# Altium footprint library pUFM_Digital_Interface_R0.1-PCB.PcbLib: 49 footprints (part 3 of 4)
Each footprint in its own frame and in the unit in brackets; x right, y up, seen from the top. Pads: shape width x height; smd on the part's side, far side on the other; paste and mask are expansions set on the pad; w line width, h text height; cw(c..) or ccw(c..) is an arc to the next point about the centre after c.
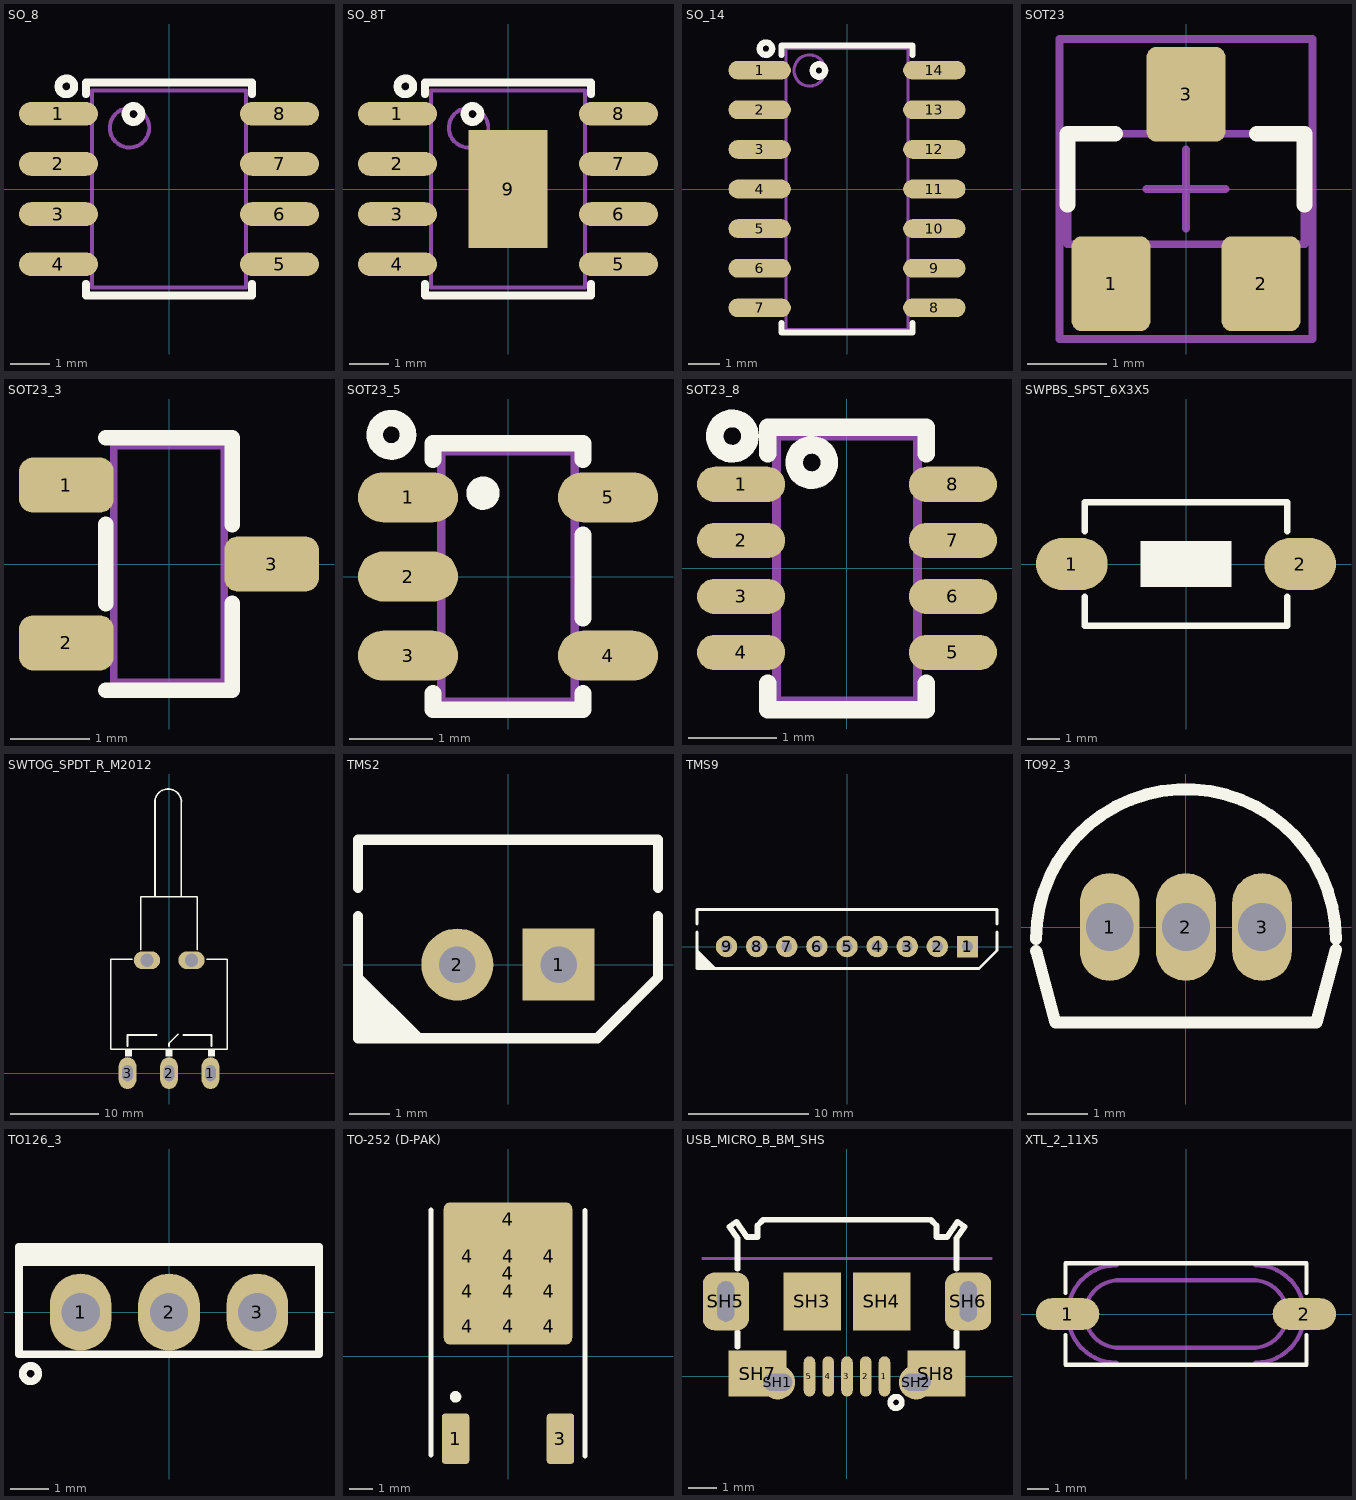
[diagram p2: the footprints below, top view; thin cyan lines are the x and y axes]

## SO_8 [mm] "SOP-8, 5x3.9mm body 1.27mm pitch, SOT96-1, M08A, S8, SOIC8, VO8, MS-012AA(JEDEC), R-8, 8S2, VOG8"
height 1.8
pads (8):
  oval 2x0.6 smd: 1(-2.8,1.905) 2(-2.8,0.635) 3(-2.8,-0.635) 4(-2.8,-1.905) 5(2.8,-1.905) 6(2.8,-0.635) 7(2.8,0.635) 8(2.8,1.905)
Top Overlay:
  circle w0.2: c-2.6,2.6 r0.2
  circle w0.2: c-0.9,1.9 r0.2
  lines w0.2: -2.1,-2.4 -2.1,-2.7 2.1,-2.7 2.1,-2.4 ; -2.1,2.4 -2.1,2.7 2.1,2.7 2.1,2.4
Mechanical 13:
  circle w0.1: c-1,1.55 r0.5
  lines w0.1: -1.95,-2.5 1.95,-2.5 1.95,2.5 -1.95,2.5 -1.95,-2.5
3D body "User Library-so8-3.step": height 1.7, standoff 0, extent -3,-2.45 3,2.45

## SO_8T [mm] "SOP-8, 5x3.9mm body 1.27mm pitch, DDA, SO PowerPAD"
height 1.8
pads (9):
  oval 2x0.6 smd: 1(-2.8,1.905) 2(-2.8,0.635) 3(-2.8,-0.635) 4(-2.8,-1.905) 5(2.8,-1.905) 6(2.8,-0.635) 7(2.8,0.635) 8(2.8,1.905)
  rect 2x3 smd paste-3 mask+0.1: 9(0,0)
Top Overlay:
  circle w0.2: c-2.6,2.6 r0.2
  circle w0.2: c-0.9,1.9 r0.2
  lines w0.2: -2.1,-2.4 -2.1,-2.7 2.1,-2.7 2.1,-2.4 ; -2.1,2.4 -2.1,2.7 2.1,2.7 2.1,2.4
Top Paste:
  rectangle: -0.8,0.2 0.8,1.3
  rectangle: -0.8,-1.3 0.8,-0.2
Mechanical 13:
  circle w0.1: c-1,1.55 r0.5
  lines w0.1: -1.95,-2.5 1.95,-2.5 1.95,2.5 -1.95,2.5 -1.95,-2.5
3D body "User Library-so8-3.step": height 1.7, standoff 0, extent -3,-2.45 3,2.45

## SO_14 [mm] "SOP, SOIC, 3.9mm width, 1.27mm pitch,"
height 6.5
pads (14):
  oval 2x0.6 smd: 1(-2.8,3.81) 2(-2.8,2.54) 3(-2.8,1.27) 4(-2.8,0) 5(-2.8,-1.27) 6(-2.8,-2.54) 7(-2.8,-3.81) 8(2.8,-3.81) 9(2.8,-2.54) 10(2.8,-1.27) 11(2.8,0) 12(2.8,1.27) 13(2.8,2.54) 14(2.8,3.81)
Top Overlay:
  circle w0.2: c-0.9,3.8 r0.2
  circle w0.2: c-2.6,4.5 r0.2
  lines w0.2: -2.1,-4.3 -2.1,-4.6 2.1,-4.6 2.1,-4.3 ; -2.1,4.3 -2.1,4.6 2.1,4.6 2.1,4.3
Mechanical 13:
  circle w0.1: c-1.2,3.8 r0.5
  lines w0.1: -1.95,-4.5 -1.95,4.5 1.95,4.5 1.95,-4.5 -1.95,-4.5
3D body "User Library-SOIC14_JEDEC_MS-012AB.step": height 1.75, standoff -0.01, extent -3.1,-4.375 3.1,4.375

## SOT23 [mm] "SOT23, 3-Leads, Body 2.9x1.3mm, Pitch 0.95mm, Lead Span 2.3mm - Reverse Pinning, IPC High Density"
height 1.1
pads (3):
  rrect25% 1x1.2 smd paste-1.2: 1(-0.95,-1.2) 2(0.95,-1.2) 3(0,1.2)
Top Overlay:
  lines w0.2: -1.5,-0.2 -1.5,0.7 -0.9,0.7 ; 0.9,0.7 1.5,0.7 1.5,-0.2
Top Paste:
  region: -0.55,1.7 -0.55,0.8 -0.55,0.77 -0.527,0.715 -0.485,0.673 -0.43,0.65 -0.4,0.65 0.4,0.65 0.43,0.65 0.485,0.673 0.527,0.715 0.55,0.77 0.55,0.8 0.55,1.7 0.55,1.73 0.527,1.785 0.485,1.827 0.43,1.85 0.4,1.85 -0.4,1.85 -0.43,1.85 -0.485,1.827 -0.527,1.785 -0.55,1.73
  region: 1.5,-1.7 1.5,-0.8 1.5,-0.77 1.477,-0.715 1.435,-0.673 1.38,-0.65 1.35,-0.65 0.55,-0.65 0.52,-0.65 0.465,-0.673 0.423,-0.715 0.4,-0.77 0.4,-0.8 0.4,-1.7 0.4,-1.73 0.423,-1.785 0.465,-1.827 0.52,-1.85 0.55,-1.85 1.35,-1.85 1.38,-1.85 1.435,-1.827 1.477,-1.785 1.5,-1.73
  region: -0.4,-1.7 -0.4,-0.8 -0.4,-0.77 -0.423,-0.715 -0.465,-0.673 -0.52,-0.65 -0.55,-0.65 -1.35,-0.65 -1.38,-0.65 -1.435,-0.673 -1.477,-0.715 -1.5,-0.77 -1.5,-0.8 -1.5,-1.7 -1.5,-1.73 -1.477,-1.785 -1.435,-1.827 -1.38,-1.85 -1.35,-1.85 -0.55,-1.85 -0.52,-1.85 -0.465,-1.827 -0.423,-1.785 -0.4,-1.73
Mechanical 11:
  lines w0.1: -1.176,-0.7 -1.176,-1.25 -0.73,-1.25 -0.73,-0.7 ; -0.5,0 0.5,0 ; -0.223,0.7 -0.223,1.226 0.223,1.226 0.223,0.7 ; 0,-0.5 0,0.5 ; 0.73,-0.7 0.73,-1.25 1.176,-1.25 1.176,-0.7 ; -1.5,-0.7 -1.5,0.7 1.5,0.7 1.5,-0.7 -1.5,-0.7
Mechanical 15:
  lines w0.1: -0.5,0 0.5,0 ; 0,-0.5 0,0.5 ; -1.6,-1.9 -1.6,1.9 1.6,1.9 1.6,-1.9 -1.6,-1.9
3D body "SOT23.stp": height 1.05, standoff 0.03, extent -1.46,-1.25 1.46,1.226
3D body: height 0.04, standoff 0, extent -0.5,0.6 0.5,1.8
3D body: height 0.04, standoff 0, extent 0.45,-1.8 1.45,-0.6
3D body: height 0.04, standoff 0, extent -1.45,-1.8 -0.45,-0.6

## SOT23_3 [mm] "SOT-23, Micro3, MO-178, TO-236AB, MO-193C, SuperSOT3, SC-59, 1.5x3mm, Pitch 1.9mm"
height 2
pads (3):
  rrect50% 1.2x0.7 smd paste-0.05 mask+0.1: 1(-1.3,1) 2(-1.3,-1) 3(1.3,0)
Top Overlay:
  lines w0.2: -0.8,-1.6 0.8,-1.6 0.8,-0.5 ; -0.8,-0.5 -0.8,0.5 ; -0.8,1.6 0.8,1.6 0.8,0.5
Mechanical 13:
  lines w0.1: -0.7,-1.5 -0.7,1.5 0.7,1.5 0.7,-1.5 -0.7,-1.5
3D body "User Library-SOT23-2.STEP": height 1.08, standoff 0, extent -1.32,-1.5 1.32,1.5

## SOT23_5 [mm] "SOT-23-5, SOT25, SOT-25, DBV(R-PDSO-G5), SOT753, TSOT23-5, SC-74A, SOT23-5, S5-T (LINEAR), MO-178AA, MO-193AB(JEDEC), MF05A (NS), TSOP-5(ON), UJ-5 (AD), 1.5x3mm, Pitch 0.65mm"
height 7.62
pads (5):
  oval 1.2x0.6 smd paste-0.05: 1(-1.2,0.95) 2(-1.2,0) 3(-1.2,-0.95) 4(1.2,-0.95) 5(1.2,0.95)
Top Overlay:
  circle w0.2: c-0.3,1 r0.1
  circle w0.2: c-1.4,1.7 r0.2
  lines w0.2: -0.9,-1.4 -0.9,-1.6 0.9,-1.6 0.9,-1.4 ; -0.9,1.4 -0.9,1.6 0.9,1.6 0.9,1.4 ; 0.9,-0.5 0.9,0.5
Mechanical 13:
  lines w0.1: -0.8,-1.5 -0.8,1.5 0.8,1.5 0.8,-1.5 -0.8,-1.5
3D body "CircuitWorks-SOT-23-5.step": height 1.15, standoff 0.05, extent -1.25,-1.5 1.25,1.5

## SOT23_8 [mm] "SOT23, 8-Leads, DCN, DDF, 1.5x3mm, Pitch 0.65mm"
height 1.5
pads (8):
  oval 1x0.4 smd paste-0.05 mask+0.075: 1(-1.2,0.953) 2(-1.2,0.318) 3(-1.2,-0.318) 4(-1.2,-0.953) 5(1.2,-0.953) 6(1.2,-0.318) 7(1.2,0.318) 8(1.2,0.953)
Top Overlay:
  circle w0.2: c-1.3,1.5 r0.2
  circle w0.2: c-0.4,1.2 r0.2
  lines w0.2: -0.9,-1.3 -0.9,-1.6 0.9,-1.6 0.9,-1.3 ; -0.9,1.3 -0.9,1.6 0.9,1.6 0.9,1.3
Mechanical 13:
  lines w0.1: -0.8,-1.5 0.8,-1.5 0.8,1.5 -0.8,1.5 -0.8,-1.5
3D body "User Library-TSOT-23-8.STEP": height 1, standoff 0, extent -1.4,-1.45 1.4,1.45

## SWPBS_SPST_6X3X5 [mm] "SWITCH, PUSHBUTTON, SMD, SPST, 6X3.5mm, SKQMBBE010, 50000 Cycles, 1.57N Force"
height 5
pads (2):
  oval 2.2x1.6 smd mask+0.1: 1(-3.5,0) 2(3.5,0)
Top Overlay:
  region: 1.4,0.7 -1.4,0.7 -1.4,-0.7 1.4,-0.7
  lines w0.2: -3.1,-1 -3.1,-1.9 3.1,-1.9 3.1,-1 ; -3.1,1 -3.1,1.9 3.1,1.9 3.1,1
3D body "43685.stp": height 5, standoff 0, extent -3.649,-1.75 3.65,1.75

## SWTOG_SPDT_R_M2012 [mm] "Switch Toggle, SPDT, THD, RightAngLe, NKK M2012SA2W30, MTS-102-C3"
height 6.5
pads (5):
  oval 2x3.6 hole 1.2 slot 1.8 at 90 deg: 1(4.7,0) 2(0,0) 3(-4.7,0)
  oval 3x2 hole 1.5: ""(-2.5,12.8) ""(2.549,12.8)
Top Overlay:
  rectangle: -0.4,1.9 0.4,2.7
  rectangle: -5,1.9 -4.2,2.7
  rectangle: 4.4,1.9 5.2,2.7
  lines w0.2: -4.699,3.064 -4.699,4.334 -1.397,4.334 ; -4.2,12.9 -6.6,12.9 -6.6,2.7 6.6,2.7 6.6,12.9 4.3,12.9 ; -3.2,13.995 -3.2,20 3.2,20 3.2,14 ; -1.6,20 -1.6,30.9 cw(c-0.1,30.7) 1.408,30.831 ; 0,3.038 0,3.394 1.016,4.41 ; 1.4,20.1 1.4,30.83 ; 1.651,4.334 4.826,4.334 4.826,3.038
3D body "SW3dPS-Switch toggle NKK M2012SA2W30.STEP": height 8.06, standoff -4.18, extent -6.502,-0.575 6.502,32.234

## TMS2 [mm] "Header 2.5mm SPOX,WTB,vert, shrouded, 2w"
height 5.9
pads (2):
  rect 1.778x1.778 hole 0.9: 1(1.25,0)
  round 1.778 hole 0.9: 2(-1.25,0)
Top Overlay:
  region: -3.7,-0.32 -3.7,-1.82 -2.2,-1.82
  lines w0.254: -3.7,-0.32 -2.2,-1.82 ; -3.7,1.19 -3.7,-1.82 2.2,-1.82 3.7,-0.32 3.7,1.19 ; -3.7,1.89 -3.7,3.08 3.7,3.08 3.7,1.89
3D body "Header Pad1.stp": height 0.04, standoff 0, extent 0.35,-0.9 2.15,0.9
3D body "Header Pad1.stp": height 0.04, standoff 0, extent 0.35,-0.9 2.15,0.9
3D body "Header Pad.stp": height 0.04, standoff 0, extent -2.15,-0.9 -0.35,0.9
3D body "Header Pad.stp": height 0.04, standoff 0, extent -2.15,-0.9 -0.35,0.9
3D body "TMS2-ST.stp": height 5.9, standoff -3.5, extent -3.7,-1.825 3.7,3.075

## TMS9 [mil] "Header 2.5mm SPOX,WTB,vert, shrouded, 9w"
height 232.28
pads (9):
  rect 70x70 hole 35.43: 1(393.72,0)
  round 70 hole 35.43: 2(295.3,0) 3(196.87,0) 4(98.44,0) 5(0.01,0) 6(-98.43,0) 7(-196.86,0) 8(-295.29,0) 9(-393.72,0)
Top Overlay:
  region: -490.18,-12.6 -490.18,-71.66 -431.13,-71.66
  lines w10: -490.18,-12.6 -431.13,-71.66 ; -490.18,46.84 -490.18,-71.66 431.12,-71.65 490.18,-12.59 490.18,46.85 ; -490.18,74.4 -490.18,121.25 490.18,121.26 490.18,74.41
3D body "TMS9-ST.stp": height 232.28, standoff -137.8, extent -490.15,-71.65 490.16,121.26
3D body "Header Pad.stp": height 1.38, standoff 0, extent -429.16,-35.44 -358.29,35.43
3D body "Header Pad.stp": height 1.38, standoff 0, extent -429.15,-35.44 -358.28,35.43
3D body "Header Pad.stp": height 1.38, standoff 0, extent -330.71,-35.44 -259.85,35.43
3D body "Header Pad.stp": height 1.38, standoff 0, extent -330.73,-35.44 -259.86,35.43
3D body "Header Pad.stp": height 1.38, standoff 0, extent -35.43,-35.44 35.44,35.43
3D body "Header Pad.stp": height 1.38, standoff 0, extent -35.42,-35.44 35.45,35.43
3D body "Header Pad.stp": height 1.38, standoff 0, extent 63.01,-35.44 133.88,35.43
3D body "Header Pad.stp": height 1.38, standoff 0, extent 63,-35.44 133.87,35.43
3D body "Header Pad.stp": height 1.38, standoff 0, extent 161.43,-35.43 232.3,35.43
3D body "Header Pad.stp": height 1.38, standoff 0, extent 161.45,-35.43 232.31,35.44
3D body "Header Pad1.stp": height 1.38, standoff 0, extent 358.29,-35.43 429.16,35.44
3D body "Header Pad1.stp": height 1.38, standoff 0, extent 358.28,-35.44 429.15,35.43
3D body "Header Pad.stp": height 1.38, standoff 0, extent 259.87,-35.43 330.74,35.44
3D body "Header Pad.stp": height 1.38, standoff 0, extent 259.86,-35.43 330.72,35.43
3D body "Header Pad.stp": height 1.38, standoff 0, extent -133.85,-35.44 -62.98,35.43
3D body "Header Pad.stp": height 1.38, standoff 0, extent -133.86,-35.44 -63,35.43
3D body "Header Pad.stp": height 1.38, standoff 0, extent -232.3,-35.44 -161.43,35.43
3D body "Header Pad.stp": height 1.38, standoff 0, extent -232.28,-35.44 -161.42,35.43

## TO92_3 [mm] "TO-92, SOT54"
height 6.5
pads (3):
  oval 1x1.8 hole 0.8 mask+0.1: 1(-1.27,0) 2(0,0) 3(1.27,0)
Top Overlay:
  lines w0.2: -2.5,-0.2 cw(c0,-0.2) 2.5,-0.2 ; -2.497,-0.399 -2.178,-1.589 2.178,-1.589 2.504,-0.374
3D body "User Library-KSP92 Transistors PNP TO-92 3L (2,54mm).step": height 4.82, standoff -14.7, extent -2.38,-1.45 2.38,2.18

## TO126_3 [mm] "TO126, TO-126, SOT32 (PHIPLIPS), pitch: 2.3mm, 8X3mm"
height 6.5
pads (3):
  oval 1.6x2 hole 1: 1(-2.3,0) 2(0,0) 3(2.3,0)
Top Overlay:
  circle w0.2: c-3.6,-1.6 r0.2
  rectangle: -3.9,1.2 3.9,1.7
  lines w0.2: -3.9,-1.1 3.9,-1.1 3.9,1.7 -3.9,1.7 -3.9,-1.1
3D body "User Library-TO-126 (SOT32) Gold PCB.STEP": height 13.19, standoff -3.54, extent -3.8,-1 3.8,1.55

## TO-252 (D-PAK) [mil] "D-PAK/TO-252-AA; 3 Leads (1 Cropped); Body 10.1 (inc. leads) x 6.6 mm (LxW max)"
height 94.49
pads (13):
  rrect25% 47.24x86.61 smd: 1(-89.96,-141.73) 3(89.96,-141.73)
  rrect25% 40x40 smd: 4(-70,51) 4(-70,111) 4(-70,171) 4(0,51) 4(0,111) 4(0,171) 4(70,51) 4(70,111) 4(70,171)
  rrect10% 220.47x244.09 smd paste-122.05: 4(0,141.73)
  rrect25% 188.98x43.31 smd: 4(0,234.94)
Top Overlay:
  circle w9.84: c-89.96,-69.88 r4.92
  lines w7.87: -132,-170.26 -132,251 ; 132,-171.26 132,250
3D body "SW3dPS-DPAK-1.STEP": height 94.98, standoff -0.1, extent -128.73,-157.77 128.75,233.5
3D body: height 1.38, standoff 0, extent 66.34,-185.04 113.58,-98.43
3D body: height 1.38, standoff 0, extent -113.58,-185.04 -66.34,-98.43
3D body: height 1.38, standoff 0, extent -110.24,19.69 110.24,263.78

## USB_MICRO_B_BM_SHS [mm] "CONN, USB Micro B - Standard (Bottom mount), Shell SMD, 473460001, ZX62-AB-5PA"
height 6.5
pads (13):
  oval 0.4x1.4 smd mask+0.05: 1(1.3,0) 2(0.65,0) 3(0,0) 4(-0.65,0) 5(-1.3,0)
  round 1.2 hole 0.6 slot 1 at 0 deg mask+0.05: SH1(-2.4,-0.2) SH2(2.4,-0.2)
  rect 2x2 smd: SH3(-1.2,2.6) SH4(1.2,2.6)
  rrect50% 1.6x2 / inner oval 0.8x1.6 / far side oval 0.8x1.6 hole 0.6 slot 1.4 at 90 deg: SH5(-4.2,2.6) SH6(4.2,2.6)
  rect 2x1.6 smd: SH7(-3.1,0.1) SH8(3.1,0.1)
Top Overlay:
  circle w0.2: c1.7,-0.9 r0.2
  lines w0.2: -3.8,1.03 -3.8,1.53 ; -3.8,3.73 -3.8,4.791 -4.078,5.192 -3.831,5.363 -3.462,4.83 -3.1,4.83 -3.1,5.23 -2.9,5.43 2.8,5.43 ; 2.9,5.43 3.1,5.23 3.1,4.83 3.462,4.83 3.831,5.363 4.078,5.192 3.8,4.791 3.8,3.73 ; 3.8,1.03 3.8,1.53
Mechanical 1:
  lines w0.1: -5,4.092 5,4.092
  text "PCB EDGE" at -2.7,4.4 h0.8
3D body "473460001.stp": height 2.72, standoff -0.22, extent -3.99,-0.3 3.99,5.13

## XTL_2_11X5 [mm] "SMD crystal resonator, ABL, ABLS, HC-49, HC49 11X4.5MM"
height 6.5
pads (2):
  oval 3x1.5 smd: 1(-5.6,0) 2(5.6,0)
Top Overlay:
  lines w0.2: -5.7,-1 -5.7,-2.4 5.7,-2.4 5.7,-1 ; -5.7,1 -5.7,2.4 5.7,2.4 5.7,1
Mechanical 13:
  lines w0.2: -3.302,-2.3 cw(c-3.302,0) -3.302,2.3 ; -3.302,-1.6 3.302,-1.6 ; -3.302,1.6 3.302,1.6 ; -3.175,-1.6 cw(c-3.175,0) -3.175,1.6 ; 3.175,-1.6 ccw(c3.175,0) 3.175,1.6 ; 3.302,-2.3 ccw(c3.302,0) 3.302,2.3
3D body "User Library-Crystal HC49_US-SM.step": height 4.3, standoff 0, extent -6.4,-2.415 6.4,2.415